# Altium footprint library Active.PcbLib: 308 footprints (part 19 of 22)
Each footprint in its own frame and in the unit in brackets; x right, y up, seen from the top. Pads: shape width x height; smd on the part's side, far side on the other; paste and mask are expansions set on the pad; w line width, h text height; cw(c..) or ccw(c..) is an arc to the next point about the centre after c.
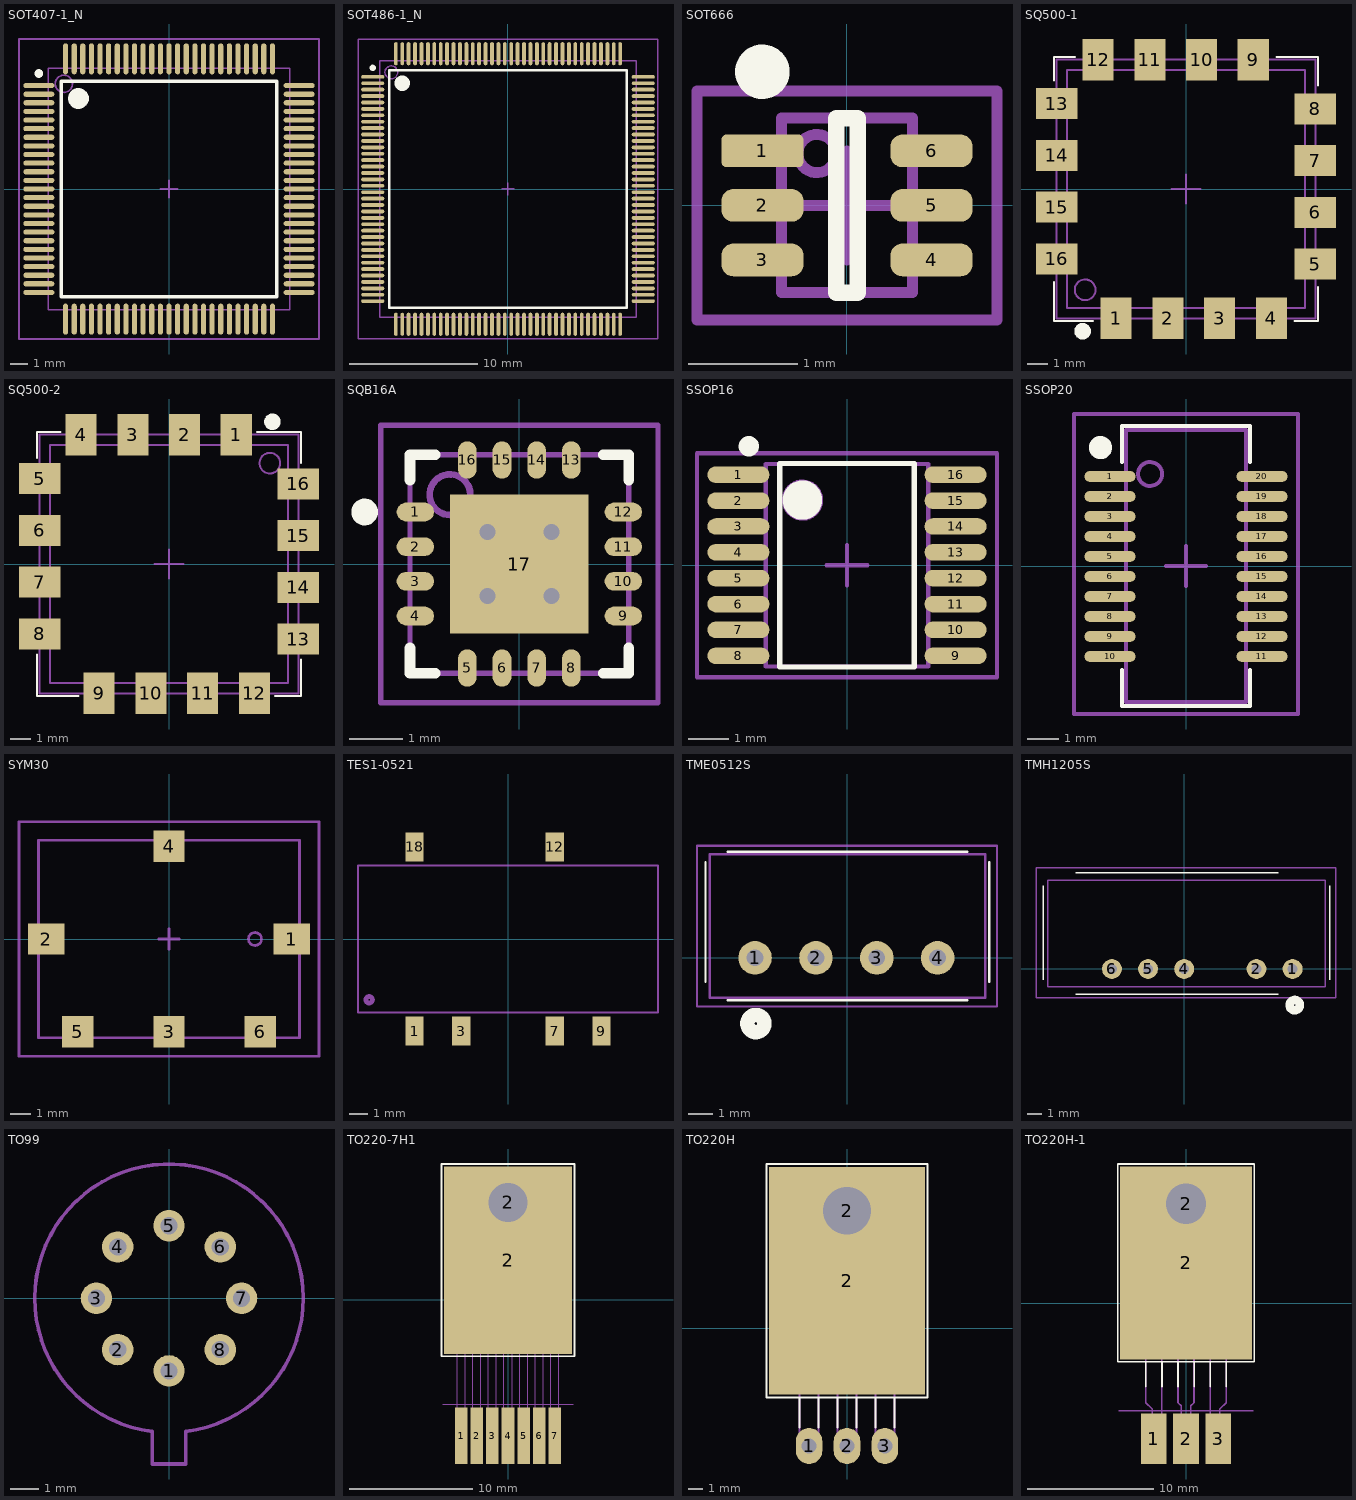
[diagram p18: the footprints below, top view; thin cyan lines are the x and y axes]

## SOT407-1_N [mm] "Thin QFP, 100-Leads, Body 14x14mm, Pitch 0.5mm, IPC Medium Density"
height 1.6
pads (100):
  oval 1.8x0.3 smd mask+0.051: 1(-7.55,6) 2(-7.55,5.5) 3(-7.55,5) 4(-7.55,4.5) 5(-7.55,4) 6(-7.55,3.5) 7(-7.55,3) 8(-7.55,2.5) 9(-7.55,2) 10(-7.55,1.5) 11(-7.55,1) 12(-7.55,0.5) 13(-7.55,0) 14(-7.55,-0.5) 15(-7.55,-1) 16(-7.55,-1.5) 17(-7.55,-2) 18(-7.55,-2.5) 19(-7.55,-3) 20(-7.55,-3.5) 21(-7.55,-4) 22(-7.55,-4.5) 23(-7.55,-5) 24(-7.55,-5.5) 25(-7.55,-6) 51(7.55,-6) 52(7.55,-5.5) 53(7.55,-5) 54(7.55,-4.5) 55(7.55,-4) 56(7.55,-3.5) 57(7.55,-3) 58(7.55,-2.5) 59(7.55,-2) 60(7.55,-1.5) 61(7.55,-1) 62(7.55,-0.5) 63(7.55,0) 64(7.55,0.5) 65(7.55,1) 66(7.55,1.5) 67(7.55,2) 68(7.55,2.5) 69(7.55,3) 70(7.55,3.5) 71(7.55,4) 72(7.55,4.5) 73(7.55,5) 74(7.55,5.5) 75(7.55,6)
  oval 0.3x1.8 smd mask+0.051: 26(-6,-7.55) 27(-5.5,-7.55) 28(-5,-7.55) 29(-4.5,-7.55) 30(-4,-7.55) 31(-3.5,-7.55) 32(-3,-7.55) 33(-2.5,-7.55) 34(-2,-7.55) 35(-1.5,-7.55) 36(-1,-7.55) 37(-0.5,-7.55) 38(0,-7.55) 39(0.5,-7.55) 40(1,-7.55) 41(1.5,-7.55) 42(2,-7.55) 43(2.5,-7.55) 44(3,-7.55) 45(3.5,-7.55) 46(4,-7.55) 47(4.5,-7.55) 48(5,-7.55) 49(5.5,-7.55) 50(6,-7.55) 76(6,7.55) 77(5.5,7.55) 78(5,7.55) 79(4.5,7.55) 80(4,7.55) 81(3.5,7.55) 82(3,7.55) 83(2.5,7.55) 84(2,7.55) 85(1.5,7.55) 86(1,7.55) 87(0.5,7.55) 88(0,7.55) 89(-0.5,7.55) 90(-1,7.55) 91(-1.5,7.55) 92(-2,7.55) 93(-2.5,7.55) 94(-3,7.55) 95(-3.5,7.55) 96(-4,7.55) 97(-4.5,7.55) 98(-5,7.55) 99(-5.5,7.55) 100(-6,7.55)
Top Overlay:
  circle w0.25: c-7.55,6.7 r0.125
  circle w0.6: c-5.25,5.25 r0.3
  lines w0.2: -6.25,-6.25 -6.25,6.25 6.25,6.25 6.25,-6.25 -6.25,-6.25
Mechanical 13:
  circle w0.1: c-6.1,6.1 r0.5
  lines w0.1: -7,-7 -7,7 7,7 7,-7 -7,-7
Mechanical 15:
  lines w0.1: -0.5,0 0.5,0 ; 0,-0.5 0,0.5 ; -8.7,-8.7 -8.7,8.7 8.7,8.7 8.7,-8.7 -8.7,-8.7
3D body: height 1.6, standoff 0, extent -7,-7 7,7
3D body: height 1.61, standoff 1.6, extent -6.61,5.59 -5.59,6.61

## SOT486-1_N [mm] "Thin QFP, 144-Leads, Body 20x20mm, Pitch 0.5mm, IPC Medium Density"
height 1.6
pads (144):
  oval 1.8x0.3 smd mask+0.051: 1(-10.55,8.75) 2(-10.55,8.25) 3(-10.55,7.75) 4(-10.55,7.25) 5(-10.55,6.75) 6(-10.55,6.25) 7(-10.55,5.75) 8(-10.55,5.25) 9(-10.55,4.75) 10(-10.55,4.25) 11(-10.55,3.75) 12(-10.55,3.25) 13(-10.55,2.75) 14(-10.55,2.25) 15(-10.55,1.75) 16(-10.55,1.25) 17(-10.55,0.75) 18(-10.55,0.25) 19(-10.55,-0.25) 20(-10.55,-0.75) 21(-10.55,-1.25) 22(-10.55,-1.75) 23(-10.55,-2.25) 24(-10.55,-2.75) 25(-10.55,-3.25) 26(-10.55,-3.75) 27(-10.55,-4.25) 28(-10.55,-4.75) 29(-10.55,-5.25) 30(-10.55,-5.75) 31(-10.55,-6.25) 32(-10.55,-6.75) 33(-10.55,-7.25) 34(-10.55,-7.75) 35(-10.55,-8.25) 36(-10.55,-8.75) 73(10.55,-8.75) 74(10.55,-8.25) 75(10.55,-7.75) 76(10.55,-7.25) 77(10.55,-6.75) 78(10.55,-6.25) 79(10.55,-5.75) 80(10.55,-5.25) 81(10.55,-4.75) 82(10.55,-4.25) 83(10.55,-3.75) 84(10.55,-3.25) 85(10.55,-2.75) 86(10.55,-2.25) 87(10.55,-1.75) 88(10.55,-1.25) 89(10.55,-0.75) 90(10.55,-0.25) 91(10.55,0.25) 92(10.55,0.75) 93(10.55,1.25) 94(10.55,1.75) 95(10.55,2.25) 96(10.55,2.75) 97(10.55,3.25) 98(10.55,3.75) 99(10.55,4.25) 100(10.55,4.75) 101(10.55,5.25) 102(10.55,5.75) 103(10.55,6.25) 104(10.55,6.75) 105(10.55,7.25) 106(10.55,7.75) 107(10.55,8.25) 108(10.55,8.75)
  oval 0.3x1.8 smd mask+0.051: 37(-8.75,-10.55) 38(-8.25,-10.55) 39(-7.75,-10.55) 40(-7.25,-10.55) 41(-6.75,-10.55) 42(-6.25,-10.55) 43(-5.75,-10.55) 44(-5.25,-10.55) 45(-4.75,-10.55) 46(-4.25,-10.55) 47(-3.75,-10.55) 48(-3.25,-10.55) 49(-2.75,-10.55) 50(-2.25,-10.55) 51(-1.75,-10.55) 52(-1.25,-10.55) 53(-0.75,-10.55) 54(-0.25,-10.55) 55(0.25,-10.55) 56(0.75,-10.55) 57(1.25,-10.55) 58(1.75,-10.55) 59(2.25,-10.55) 60(2.75,-10.55) 61(3.25,-10.55) 62(3.75,-10.55) 63(4.25,-10.55) 64(4.75,-10.55) 65(5.25,-10.55) 66(5.75,-10.55) 67(6.25,-10.55) 68(6.75,-10.55) 69(7.25,-10.55) 70(7.75,-10.55) 71(8.25,-10.55) 72(8.75,-10.55) 109(8.75,10.55) 110(8.25,10.55) 111(7.75,10.55) 112(7.25,10.55) 113(6.75,10.55) 114(6.25,10.55) 115(5.75,10.55) 116(5.25,10.55) 117(4.75,10.55) 118(4.25,10.55) 119(3.75,10.55) 120(3.25,10.55) 121(2.75,10.55) 122(2.25,10.55) 123(1.75,10.55) 124(1.25,10.55) 125(0.75,10.55) 126(0.25,10.55) 127(-0.25,10.55) 128(-0.75,10.55) 129(-1.25,10.55) 130(-1.75,10.55) 131(-2.25,10.55) 132(-2.75,10.55) 133(-3.25,10.55) 134(-3.75,10.55) 135(-4.25,10.55) 136(-4.75,10.55) 137(-5.25,10.55) 138(-5.75,10.55) 139(-6.25,10.55) 140(-6.75,10.55) 141(-7.25,10.55) 142(-7.75,10.55) 143(-8.25,10.55) 144(-8.75,10.55)
Top Overlay:
  circle w0.25: c-10.55,9.45 r0.125
  circle w0.6: c-8.25,8.25 r0.3
  lines w0.2: -9.25,-9.25 -9.25,9.25 9.25,9.25 9.25,-9.25 -9.25,-9.25
Mechanical 13:
  circle w0.1: c-9.1,9.1 r0.5
  lines w0.1: -10,-10 -10,10 10,10 10,-10 -10,-10
Mechanical 15:
  lines w0.1: -0.5,0 0.5,0 ; 0,-0.5 0,0.5 ; -11.7,-11.7 -11.7,11.7 11.7,11.7 11.7,-11.7 -11.7,-11.7
3D body: height 1.61, standoff 1.6, extent -9.61,8.59 -8.59,9.61
3D body: height 1.6, standoff 0, extent -10,-10 10,10

## SOT666 [mm] "SOT666, 6-Leads, Body 1,2x1,6mm, Pitch 0,50mm, IPC Medium Density"
height 0.6
pads (6):
  rrect30% 0.75x0.3 smd mask+0.051: 1(-0.775,0.5)
  rrect70% 0.75x0.3 smd mask+0.051: 2(-0.775,0) 3(-0.775,-0.5) 4(0.775,-0.5) 5(0.775,0) 6(0.775,0.5)
Top Overlay:
  circle w0.25: c-0.775,1.225 r0.125
  lines w0.15: -0.1,-0.8 0.1,-0.8 0.1,0.8 -0.1,0.8 -0.1,-0.8
Mechanical 13:
  circle w0.1: c-0.275,0.475 r0.175
  lines w0.1: -0.6,-0.8 -0.6,0.8 0.6,0.8 0.6,-0.8 -0.6,-0.8
Mechanical 15:
  lines w0.1: -0.5,0 0.5,0 ; 0,-0.5 0,0.5 ; -1.375,-1.05 -1.375,1.05 1.375,1.05 1.375,-1.05 -1.375,-1.05
3D body: height 0.18, standoff 0, extent 0.6,0.4 0.85,0.6
3D body: height 0.18, standoff 0, extent 0.6,-0.1 0.85,0.1
3D body: height 0.18, standoff 0, extent 0.6,-0.6 0.85,-0.4
3D body: height 0.18, standoff 0, extent -0.85,-0.6 -0.6,-0.4
3D body: height 0.18, standoff 0, extent -0.85,-0.1 -0.6,0.1
3D body: height 0.18, standoff 0, extent -0.85,0.4 -0.6,0.6
3D body: height 0.61, standoff 0.6, extent -0.525,0.225 -0.027,0.724
3D body: height 0.6, standoff 0, extent -0.6,-0.8 0.6,0.8

## SQ500-1 [mil] "VCO hybrid 0.5\" square 16 pin"
height 140
pads (16):
  rect 60x80 smd: 1(-135,-250) 2(-35,-250) 3(65,-250) 4(165,-250) 9(130,250) 10(30,250) 11(-70,250) 12(-170,250)
  rect 80x60 smd: 5(250,-145) 6(250,-45) 7(250,55) 8(250,155) 13(-250,165) 14(-250,65) 15(-250,-35) 16(-250,-135)
Top Overlay:
  circle w16: c-200,-275 r8
  lines w4.02: -255,-180 -255,-255 -180,-255 ; -255,210 -255,255 -215,255 ; 175,255 255,255 255,200 ; 210,-255 255,-255 255,-190
Mechanical 13:
  circle w3.94: c-195,-195 r20
  lines w3.94: -250,-155 ccw(c-250,-135) -250,-115 ; -250,-55 ccw(c-250,-35) -250,-15 ; -250,45 ccw(c-250,65) -250,85 ; -250,145 ccw(c-250,165) -250,185 ; -190,250 ccw(c-170,250) -150,250 ; -155,-250 cw(c-135,-250) -115,-250 ; -90,250 ccw(c-70,250) -50,250 ; -55,-250 cw(c-35,-250) -15,-250 ; 10,250 ccw(c30,250) 50,250 ; 45,-250 cw(c65,-250) 85,-250 ; 110,250 ccw(c130,250) 150,250 ; 145,-250 cw(c165,-250) 185,-250 ; 250,-165 cw(c250,-145) 250,-125 ; 250,-65 cw(c250,-45) 250,-25 ; 250,35 cw(c250,55) 250,75 ; 250,135 cw(c250,155) 250,175
  lines w4.02: -250,-155 -250,-250 -155,-250 ; -250,-115 -250,-55 ; -250,-15 -250,45 ; -250,85 -250,145 ; -250,185 -250,250 -190,250 ; -150,250 -90,250 ; -115,-250 -55,-250 ; -50,250 10,250 ; -15,-250 45,-250 ; 50,250 110,250 ; 85,-250 145,-250 ; 150,250 250,250 250,175 ; 185,-250 250,-250 250,-165 ; 250,-125 250,-65 ; 250,-25 250,35 ; 250,75 250,135 ; -230,-230 230,-230 230,230 -230,230 -230,-230
Mechanical 15:
  lines w4.02: -27.56,0 27.56,0 ; 0,-27.56 0,27.56
3D body: height 142, standoff 140, extent -215.39,-215.39 -174.61,-174.61
3D body: height 140, standoff 0, extent -230,-230 230,230
3D body: height 25, standoff 0, extent -250,-250 250,250

## SQ500-2 [mil] "VCO hybrid 0.5\" square 16 pin Z-Comm."
height 140
pads (16):
  rect 60x80 smd: 1(130,250) 2(30,250) 3(-70,250) 4(-170,250) 9(-135,-250) 10(-35,-250) 11(65,-250) 12(165,-250)
  rect 80x60 smd: 5(-250,165) 6(-250,65) 7(-250,-35) 8(-250,-135) 13(250,-145) 14(250,-45) 15(250,55) 16(250,155)
Top Overlay:
  circle w16: c200,275 r8
  lines w4.02: -255,-175 -255,-255 -175,-255 ; -255,205 -255,255 -210,255 ; 170,255 255,255 255,195 ; 205,-255 255,-255 255,-185
Mechanical 13:
  circle w3.94: c195,195 r20
  lines w3.94: -250,-155 ccw(c-250,-135) -250,-115 ; -250,-55 ccw(c-250,-35) -250,-15 ; -250,45 ccw(c-250,65) -250,85 ; -250,145 ccw(c-250,165) -250,185 ; -190,250 ccw(c-170,250) -150,250 ; -155,-250 cw(c-135,-250) -115,-250 ; -90,250 ccw(c-70,250) -50,250 ; -55,-250 cw(c-35,-250) -15,-250 ; 10,250 ccw(c30,250) 50,250 ; 45,-250 cw(c65,-250) 85,-250 ; 110,250 ccw(c130,250) 150,250 ; 145,-250 cw(c165,-250) 185,-250 ; 250,-165 cw(c250,-145) 250,-125 ; 250,-65 cw(c250,-45) 250,-25 ; 250,35 cw(c250,55) 250,75 ; 250,135 cw(c250,155) 250,175
  lines w4.02: -250,-155 -250,-250 -155,-250 ; -250,-115 -250,-55 ; -250,-15 -250,45 ; -250,85 -250,145 ; -250,185 -250,250 -190,250 ; -150,250 -90,250 ; -115,-250 -55,-250 ; -50,250 10,250 ; -15,-250 45,-250 ; 50,250 110,250 ; 85,-250 145,-250 ; 150,250 250,250 250,175 ; 185,-250 250,-250 250,-165 ; 250,-125 250,-65 ; 250,-25 250,35 ; 250,75 250,135 ; -230,-230 230,-230 230,230 -230,230 -230,-230
Mechanical 15:
  lines w4.02: -27.56,0 27.56,0 ; 0,-27.56 0,27.56
3D body: height 25, standoff 0, extent -250,-250 250,250
3D body: height 140, standoff 0, extent -230,-230 230,230

## SQB16A [mm] "QFN, 16-Leads, Body 4,1x4,1mm (max), Pitch 0,65mm, IPC Medium Density"
height 0.8
pads (17):
  oval 0.7x0.35 smd mask+0.051: 1(-1.95,0.975) 2(-1.95,0.325) 3(-1.95,-0.325) 4(-1.95,-0.975) 9(1.95,-0.975) 10(1.95,-0.325) 11(1.95,0.325) 12(1.95,0.975)
  oval 0.35x0.7 smd mask+0.051: 5(-0.975,-1.95) 6(-0.325,-1.95) 7(0.325,-1.95) 8(0.975,-1.95) 13(0.975,1.95) 14(0.325,1.95) 15(-0.325,1.95) 16(-0.975,1.95)
  rect 2.6x2.6 smd paste-5 mask-5: 17(0,0)
via 0.6,-0.6 diameter 0.65 hole 0.3
via 0.6,0.6 diameter 0.65 hole 0.3
via -0.6,0.6 diameter 0.65 hole 0.3
via -0.6,-0.6 diameter 0.65 hole 0.3
Top Overlay:
  circle w0.25: c-2.9,0.975 r0.125
  lines w0.2: -2.05,-1.575 -2.05,-2.05 -1.575,-2.05 ; -2.05,1.575 -2.05,2.05 -1.575,2.05 ; 1.575,-2.05 2.05,-2.05 2.05,-1.575 ; 1.575,2.05 2.05,2.05 2.05,1.575
Top Paste:
  region: -1.275,1.275 -0.75,1.275 -0.75,0.925 -0.925,0.75 -1.275,0.75
  region: -1.275,0.45 -0.925,0.45 -0.75,0.275 -0.75,-0.275 -0.925,-0.45 -1.275,-0.45
  region: -0.45,-0.275 -0.275,-0.45 0.275,-0.45 0.45,-0.275 0.45,0.275 0.275,0.45 -0.275,0.45 -0.45,0.275
  region: -1.275,-1.275 -1.275,-0.75 -0.925,-0.75 -0.75,-0.925 -0.75,-1.275
  region: 1.275,-1.275 0.75,-1.275 0.75,-0.925 0.925,-0.75 1.275,-0.75
  region: 1.275,1.275 1.275,0.75 0.925,0.75 0.75,0.925 0.75,1.275
  region: -0.45,-1.275 -0.45,-0.925 -0.275,-0.75 0.275,-0.75 0.45,-0.925 0.45,-1.275
  region: 1.275,-0.45 0.925,-0.45 0.75,-0.275 0.75,0.275 0.925,0.45 1.275,0.45
  region: 0.45,1.275 0.45,0.925 0.275,0.75 -0.275,0.75 -0.45,0.925 -0.45,1.275
Top Solder:
  region: -1.35,1.35 -0.6,1.35 -0.6,0.931 -0.727,0.906 -0.834,0.834 -0.906,0.727 -0.931,0.6 -0.906,0.473 -0.834,0.366 -0.727,0.294 -0.6,0.269 -0.6,0.275 -0.6,-0.275 -0.6,-0.269 -0.727,-0.294 -0.834,-0.366 -0.906,-0.473 -0.931,-0.6 -0.906,-0.727 -0.834,-0.834 -0.727,-0.906 -0.6,-0.931 -0.473,-0.906 -0.366,-0.834 -0.294,-0.727 -0.269,-0.6 -0.275,-0.6 0.275,-0.6 0.269,-0.6 0.294,-0.727 0.366,-0.834 0.473,-0.906 0.6,-0.931 0.727,-0.906 0.834,-0.834 0.906,-0.727 0.931,-0.6 0.906,-0.473 0.834,-0.366 0.727,-0.294 0.6,-0.269 0.6,-0.275 0.6,0.275 0.6,0.269 0.727,0.294 0.834,0.366 0.906,0.473 0.931,0.6 0.906,0.727 0.834,0.834 0.727,0.906 0.6,0.931 0.473,0.906 0.366,0.834 0.294,0.727 0.269,0.6 0.275,0.6 0.269,0.6 0.294,0.473 0.366,0.366 0.473,0.294 0.6,0.269 0.6,0.275 0.6,-0.269 0.473,-0.294 0.366,-0.366 0.294,-0.473 0.269,-0.6 0.275,-0.6 -0.269,-0.6 -0.294,-0.473 -0.366,-0.366 -0.473,-0.294 -0.6,-0.269 -0.6,-0.275 -0.6,0.269 -0.473,0.294 -0.366,0.366 -0.294,0.473 -0.269,0.6 -0.275,0.6 -0.269,0.6 -0.294,0.727 -0.366,0.834 -0.473,0.906 -0.6,0.931 -0.6,0.925 -0.6,1.35 1.35,1.35 1.35,-1.35 -1.35,-1.35
Mechanical 13:
  circle w0.127: c-1.3,1.3 r0.381
  lines w0.1: -2.05,-2.05 -2.05,2.05 2.05,2.05 2.05,-2.05 -2.05,-2.05
Mechanical 15:
  lines w0.1: -0.5,0 0.5,0 ; 0,-0.5 0,0.5 ; -2.6,-2.6 -2.6,2.6 2.6,2.6 2.6,-2.6 -2.6,-2.6
3D body: height 0.81, standoff 0.8, extent -1.688,0.912 -0.912,1.688
3D body: height 0.8, standoff 0.01, extent -2.05,-2.05 2.05,2.05

## SSOP16 [mil] "SSOP 16-Leads, Body 5,0x4,0mm (max), Pitch 0,63mm, IPC Medium Density"
height 68.9
pads (16):
  oval 60x16 smd mask+2: 1(-105,87.5) 2(-105,62.5) 3(-105,37.5) 4(-105,12.5) 5(-105,-12.5) 6(-105,-37.5) 7(-105,-62.5) 8(-105,-87.5) 9(105,-87.5) 10(105,-62.5) 11(105,-37.5) 12(105,-12.5) 13(105,12.5) 14(105,37.5) 15(105,62.5) 16(105,87.5)
Top Overlay:
  circle w20: c-43,63 r9
  circle w9.84: c-94.92,115 r4.92
  lines w5: -65,-98.43 65,-98.43 65,98.43 -65,98.43 -65,-98.43
Mechanical 13:
  circle w3.94: c-43,63 r18
  lines w3.94: -78.54,-98.03 78.54,-98.03 78.54,98.03 -78.54,98.03 -78.54,-98.03
Mechanical 15:
  lines w3.94: -19.68,0 19.68,0 ; 0,-19.68 0,19.68 ; -145,-108.27 145,-108.27 145,108.27 -145,108.27 -145,-108.27
3D body: height 68.9, standoff 3.94, extent -78.54,-98.03 78.54,98.03
3D body: height 69.29, standoff 68.9, extent -61.35,44.65 -24.65,81.35

## SSOP20 [mil] "SSOP20 R0.635mm 8.6x3.8mm"
height 62.99
pads (20):
  oval 64x13.78 smd mask+2: 1(-95,112) 2(-95,87) 3(-95,62) 4(-95,37) 5(-95,12) 6(-95,-13) 7(-95,-38) 8(-95,-63) 9(-95,-88) 10(-95,-113) 11(95,-113) 12(95,-88) 13(95,-63) 14(95,-38) 15(95,-13) 16(95,12) 17(95,37) 18(95,62) 19(95,87) 20(95,112)
Top Overlay:
  circle w15: c-107,148 r7
  lines w5: -80,-130 -80,-175 80,-175 80,-130 ; -80,130 -80,175 80,175 80,130
Mechanical 13:
  circle w5: c-45,115 r15
  lines w5: -75,-170 -75,170 75,170 75,-170 -75,-170
Mechanical 15:
  lines w5: -25,0 25,0 ; 0,-25 0,25 ; -140,-185 -140,190 140,190 140,-185 -140,-185
3D body: height 62.99, standoff 5.91, extent -75,-170 75,170
3D body: height 63.39, standoff 62.99, extent -60.29,99.71 -29.71,130.29

## SYM30 [mil]
pads (6):
  rect 70x60 smd: 1(235,0) 2(-235,0)
  rect 60x60 smd: 3(0,-178) 4(0,178) 5(-175,-178) 6(175,-178)
Mechanical 13:
  circle w5: c164.72,0 r12.45
  lines w5: -250,-188.98 250,-188.98 250,188.98 -250,188.98 -250,-188.98
Mechanical 15:
  lines w5: -20,0 20,0 ; 0,-20 0,20 ; -287.4,-224.41 287.4,-224.41 287.4,224.41 -287.4,224.41 -287.4,-224.41
3D body: height 231, standoff 230, extent 151.75,-13.25 177.4,13.24
3D body: height 230, standoff 0, extent -250,-188.98 250,188.98

## TES1-0521 [mm] "TES10521 6 pin, Body 16.3x8x7mm (LxWxH), Pitch 2,54mm"
height 7
pads (6):
  rect 1x1.6 smd: 1(-5.08,-5) 3(-2.54,-5) 7(2.54,-5) 9(5.08,-5) 12(2.54,5) 18(-5.08,5)
Mechanical 13:
  circle w0.254: c-7.546,-3.302 r0.18
  lines w0.102: -8.15,-4 -8.15,4 8.15,4 8.15,-4 -8.15,-4
3D body: height 1.5, standoff 0, extent -5.334,-5.461 -4.826,-4
3D body: height 1.5, standoff 0, extent -2.794,-5.461 -2.286,-4
3D body: height 1.5, standoff 0, extent 2.286,-5.461 2.794,-4
3D body: height 1.5, standoff 0, extent 4.826,-5.461 5.334,-4
3D body: height 1.5, standoff 0, extent 2.286,4 2.794,5.461
3D body: height 1.5, standoff 0, extent -5.334,4 -4.826,5.461
3D body: height 7.01, standoff 7, extent -5.588,-3.302 -4.592,-2.304
3D body: height 7, standoff 0, extent -8.15,-4 8.15,4

## TME0512S [mm] "TME0512S 4 pin, Body 11.5x6x10.2mm (LxWxH), Pitch 2,54mm"
height 10.2
pads (4):
  round 1.4 hole 0.7: 1(-3.85,0) 2(-1.31,0) 3(1.23,0) 4(3.77,0)
Top Overlay:
  circle w0.6: c-3.814,-2.743 r0.359
  lines w0.102: -5.918,-1 -5.918,4 ; -5,-1.778 5,-1.778 ; -5,4.428 5,4.428 ; 5.918,-1 5.918,4
Mechanical 13:
  lines w0.102: -5.75,-1.675 5.75,-1.675 5.75,4.325 -5.75,4.325 -5.75,-1.675
Mechanical 15:
  lines w0.102: -6.274,-2.032 -6.274,4.674 6.248,4.674 6.248,-2.032 -6.274,-2.032
3D body: height 10.2, standoff 0.5, extent -5.105,-1.675 5.105,4.325
3D body: height 0.5, standoff 0, extent -5.75,-1.675 -5.105,4.325
3D body: height 0.5, standoff 0, extent 5.08,-1.675 5.75,4.325
3D body: height 0.5, standoff -3.2, extent 0.925,-0.203 1.509,0.203
3D body: height 0.5, standoff -3.2, extent 3.465,-0.203 4.049,0.203
3D body: height 0.5, standoff -3.2, extent -1.615,-0.203 -1.031,0.203
3D body: height 0.5, standoff -3.2, extent -4.155,-0.203 -3.571,0.203

## TMH1205S [mm] "TMH1205S 5 pin, Body 19.5x7.5x10.2mm (LxWxH), Pitch 2,54mm"
height 10.2
pads (5):
  round 1.4 hole 0.7: 1(7.62,0) 2(5.08,0) 4(0,0) 5(-2.54,0) 6(-5.08,0)
Top Overlay:
  circle w0.6: c7.769,-2.54 r0.359
  lines w0.102: -9.906,-0.762 -9.906,5.842 ; -7.62,-1.778 6.604,-1.778 ; -7.62,6.778 6.604,6.778 ; 10.246,-0.762 10.246,5.842
Mechanical 13:
  lines w0.102: -9.58,-1.25 9.92,-1.25 9.92,6.25 -9.58,6.25 -9.58,-1.25
Mechanical 15:
  lines w0.102: -10.414,-2.032 -10.414,7.112 10.668,7.112 10.668,-2.032 -10.414,-2.032
3D body: height 10.2, standoff 0.5, extent -9.58,-1.25 9.92,6.25
3D body: height 0.5, standoff 0, extent -9.58,-1.25 -8.89,6.25
3D body: height 0.5, standoff 0, extent 9.23,-1.25 9.92,6.25
3D body: height 0.5, standoff -3.2, extent -5.359,-0.203 -4.775,0.203
3D body: height 0.5, standoff -3.2, extent -2.819,-0.203 -2.235,0.203
3D body: height 0.5, standoff -3.2, extent -0.279,-0.203 0.305,0.203
3D body: height 0.5, standoff -3.2, extent 4.801,-0.203 5.385,0.203
3D body: height 0.5, standoff -3.2, extent 7.341,-0.203 7.925,0.203

## TO99 [mm] "TO-99"
height 4.7
pads (8):
  round 1.1 hole 0.6: 1(0,-2.54) 2(-1.796,-1.796) 3(-2.54,0) 4(-1.796,1.796) 5(0,2.54) 6(1.796,1.796) 7(2.54,0) 8(1.796,-1.796)
Mechanical 13:
  lines w0.127: -0.583,-5.8 0.583,-5.8 0.583,-4.664 ccw(c0,0) -0.583,-4.664 -0.583,-5.8
3D body: height 0, standoff -6, extent -2.096,1.504 -1.499,2.103
3D body: height 0, standoff -6, extent 1.504,1.499 2.102,2.097
3D body: height 0, standoff -6, extent 1.499,-2.103 2.096,-1.504
3D body: height 0, standoff -6, extent -2.103,-2.096 -1.505,-1.497
3D body: height 0, standoff -6, extent -0.305,-2.845 0.293,-2.246
3D body: height 0, standoff -6, extent -0.294,2.247 0.304,2.846
3D body: height 0, standoff -6, extent 2.247,-0.305 2.845,0.294
3D body: height 0, standoff -6, extent -2.845,-0.305 -2.247,0.294
3D body: height 1, standoff 0, extent -0.583,-5.8 0.583,-4.664
3D body: height 4.71, standoff 4.7, extent -0.305,-4.064 0.293,-3.465
3D body: height 4.7, standoff 0, extent -4.689,-4.699 4.674,4.682

## TO220-7H1 [mil] "TO-220 horizontal 7pin"
height 196.85
pads (9):
  rect 40x180 smd mask+2.76: 1(-150,-435) 2(-100,-435) 3(-50,-435) 4(0,-435) 5(50,-435) 6(100,-435) 7(150,-435)
  rect 410x600 smd paste-500: 2(0,126.02)
  round 157.48 hole 125.98 mask+47.24: 2(0,311.02)
Top Overlay:
  lines w5: -212.6,-181.06 -212.6,434.09 212.6,434.09 212.6,-181.06 -212.6,-181.06
Mechanical 13:
  circle w3.94: c0,311.02 r75
  lines w3.94: -192.92,-169.29 -192.92,156.02 ; -163,-168.98 -163,-458 -158,-490 -142,-490 -137,-458 -137,-168.98 ; -113,-168.98 -113,-458 -108,-490 -92,-490 -87,-458 -87,-168.98 ; -63,-168.98 -63,-458 -58,-490 -42,-490 -37,-458 -37,-168.98 ; -13,-168.98 -13,-458 -8,-490 8,-490 13,-458 13,-168.98 ; 37,-168.98 37,-458 42,-490 58,-490 63,-458 63,-168.98 ; 87,-168.98 87,-458 92,-490 108,-490 113,-458 113,-168.98 ; 137,-168.98 137,-458 142,-490 158,-490 163,-458 163,-168.98 ; 192.91,-169.29 192.91,156.02 ; -200,171.02 200,171.02 ; -200,171.02 -200,-168.98 200,-168.98 200,171.02 ; -200,171.02 -200,421.02 200,421.02 200,171.02 ; -200,171.02 -192.92,156.02 ; -192.92,156.02 192.91,156.02 ; 192.91,156.02 200,171.02
Mechanical 15:
  lines w3.94: -208.66,-334.65 208.66,-334.65
3D body: height 114.17, standoff 102.36, extent 137,-490 163,-168.98
3D body: height 114.17, standoff 102.36, extent -163,-490 -137,-168.98
3D body: height 114.17, standoff 102.36, extent -113,-490 -87,-168.98
3D body: height 114.17, standoff 102.36, extent -63,-490 -37,-168.98
3D body: height 114.17, standoff 102.36, extent 87,-490 113,-168.98
3D body: height 114.17, standoff 102.36, extent 37,-490 63,-168.98
3D body: height 114.17, standoff 102.36, extent -13,-490 13,-168.98
3D body: height 39.37, standoff 0, extent -200,171.02 200,421.02
3D body: height 196.85, standoff 0, extent -200,-168.98 200,171.02

## TO220H [mil] "TO-220 horizontal"
height 196.85
pads (5):
  oval 70x95 hole 39.37: 1(-100,-310) 2(0,-310) 3(100,-310)
  rect 410x600 smd paste-500: 2(0,125)
  round 157.48 hole 125.98 mask+47.24: 2(0,310)
Top Overlay:
  lines w5: -125,-260.83 -125,-182.09 ; -74.8,-260.83 -74.8,-182.09 ; -25,-260.83 -25,-182.09 ; 25.2,-260.83 25.2,-182.09 ; 75,-260.83 75,-182.09 ; 125.2,-260.83 125.2,-182.09 ; -212.6,-182.09 -212.6,433.07 212.6,433.07 212.6,-182.09 -212.6,-182.09
Mechanical 13:
  circle w5: c0,310 r75
  lines w5: -200,155 200,155 ; -125,-170 -125,-310 -75,-310 -75,-170 ; -25,-170 -25,-310 25,-310 25,-170 ; 75,-170 75,-310 125,-310 125,-170 ; -200,170 200,170 ; -200,170 -200,-170 200,-170 200,170 ; -200,170 -200,420 200,420 200,170
3D body: height 102.36, standoff 90.55, extent 75,-320 125,-170
3D body: height 90.55, standoff 0, extent 75,-320 125,-305
3D body: height 102.36, standoff 90.55, extent -25,-320 25,-170
3D body: height 90.55, standoff 0, extent -25,-320 25,-305
3D body: height 90.55, standoff 0, extent -125,-320 -75,-305
3D body: height 102.36, standoff 90.55, extent -125,-320 -75,-170
3D body: height 39.37, standoff 0, extent -200,170 200,420
3D body: height 196.85, standoff 0, extent -200,-170 200,170
3D body: height 0, standoff -125.98, extent -116.14,-317.91 -83.66,-302.17
3D body: height 0, standoff -125.98, extent -16.14,-317.91 16.34,-302.17
3D body: height 0, standoff -125.98, extent 83.86,-317.91 116.34,-302.17

## TO220H-1 [mm] "TO-220 horizontal"
height 5
pads (5):
  rect 2.032x4 smd: 1(-2.54,-10.7) 2(0,-10.7) 3(2.54,-10.7)
  rect 10.414x15.24 smd paste-12.7: 2(0,3.201)
  round 4 hole 3.2 mask+1.2: 2(0,7.9)
Top Overlay:
  lines w0.127: -3.175,-6.599 -3.175,-4.599 ; -1.9,-6.599 -1.9,-4.599 ; -0.635,-6.599 -0.635,-4.599 ; 0.64,-6.599 0.64,-4.599 ; 1.905,-6.599 1.905,-4.599 ; 3.18,-6.599 3.18,-4.599 ; -5.4,-4.599 -5.4,11.026 5.4,11.026 5.4,-4.599 -5.4,-4.599
Mechanical 13:
  circle w0.127: c0,7.9 r1.905
  lines w0.127: -5.08,3.963 5.08,3.963 ; -3.175,-4.292 -3.175,-7.848 -2.667,-8.356 -2.667,-12.345 -1.905,-12.345 -1.905,-7.848 -1.905,-4.292 ; -0.635,-4.292 -0.635,-7.848 -0.381,-8.102 -0.381,-8.356 -0.381,-12.345 0.381,-12.345 0.381,-8.102 0.635,-7.848 0.635,-4.292 ; 1.905,-4.292 1.905,-7.848 1.905,-12.345 2.667,-12.345 2.667,-8.356 3.175,-7.848 3.175,-4.292 ; -5.08,4.344 5.08,4.344 ; -5.08,4.344 -5.08,-4.292 5.08,-4.292 5.08,4.344 ; -5.08,4.344 -5.08,10.694 5.08,10.694 5.08,4.344
Mechanical 15:
  lines w0.1: -5.3,-8.5 5.3,-8.5
3D body: height 2.6, standoff 2.3, extent 1.905,-12.345 3.175,-4.292
3D body: height 2.6, standoff 2.3, extent -0.635,-12.345 0.635,-4.292
3D body: height 2.6, standoff 2.3, extent -3.175,-12.345 -1.905,-4.292
3D body: height 1, standoff 0, extent -5.08,4.344 5.08,10.694
3D body: height 5, standoff 0, extent -5.08,-4.292 5.08,4.344